# Altium footprint library SENSOR.PcbLib: 56 footprints (part 2 of 4)
Each footprint in its own frame and in the unit in brackets; x right, y up, seen from the top. Pads: shape width x height; smd on the part's side, far side on the other; paste and mask are expansions set on the pad; w line width, h text height; cw(c..) or ccw(c..) is an arc to the next point about the centre after c.
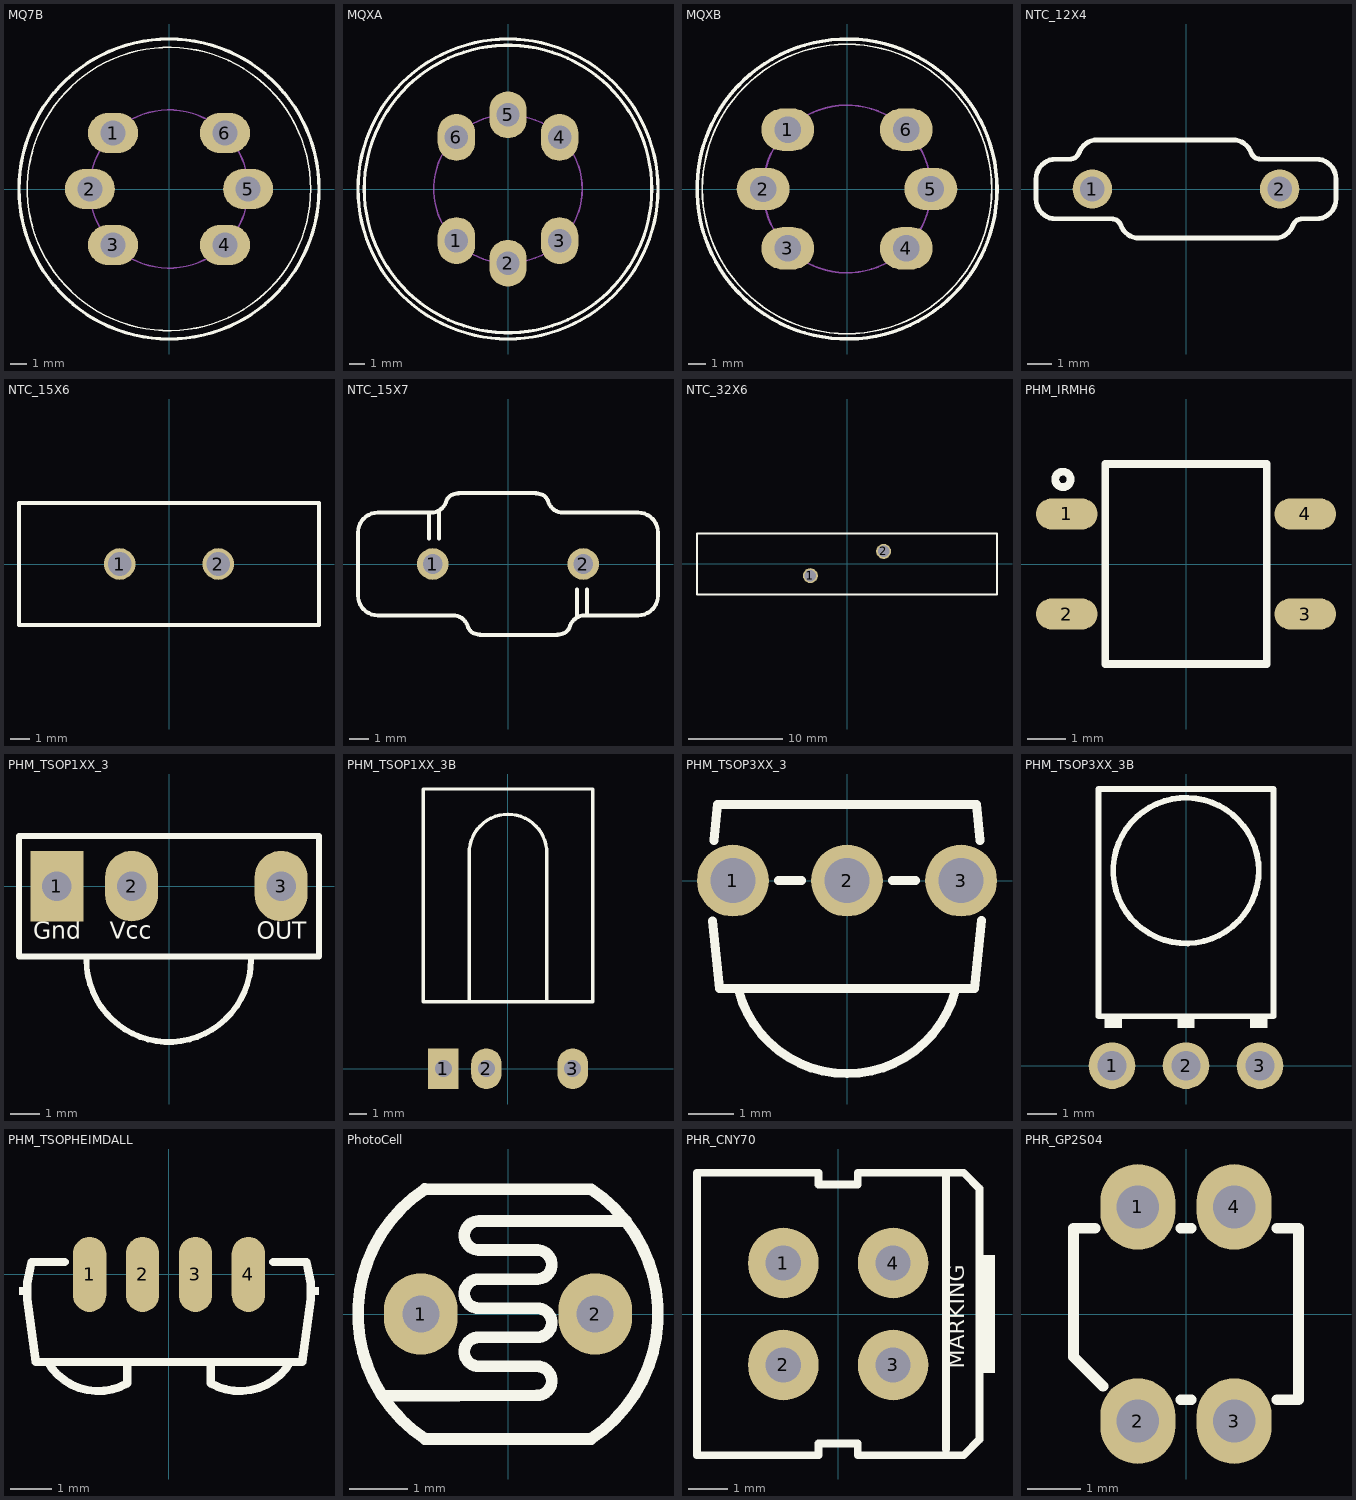
[diagram p1: the footprints below, top view; thin cyan lines are the x and y axes]

## MQ7B [mm] "Sensor GAS, 17.8mm Diameter"
height 10
pads (6):
  oval 3x2.4 hole 1.5: 1(-3.359,3.359) 2(-4.75,0) 3(-3.359,-3.359) 4(3.359,-3.359) 5(4.75,0) 6(3.359,3.359)
Top Overlay:
  circle w0.2: c0,0 r9
  circle w0.1: c0,0 r8.5
Mechanical 1:
  circle w0.1: c0,0 r4.75
3D body: height 1, standoff -5, extent -3.8,-3.8 -2.8,-2.8
3D body: height 1, standoff -5, extent -5.25,-0.5 -4.25,0.5
3D body: height 1, standoff -5, extent -3.8,2.8 -2.8,3.8
3D body: height 1, standoff -5, extent 2.8,2.8 3.8,3.8
3D body: height 1, standoff -5, extent 4.25,-0.5 5.25,0.5
3D body: height 1, standoff -5, extent 2.8,-3.8 3.8,-2.8
3D body: height 10, standoff 0, extent -8.898,-8.9 8.897,8.9

## MQXA [mm] "Sensor GAS, 19mm Diameter"
pads (6):
  oval 2.4x3 hole 1.5: 1(-3.3,-3.3) 2(0,-4.75) 3(3.3,-3.3) 4(3.3,3.3) 5(0,4.75) 6(-3.3,3.3)
Top Overlay:
  circle w0.2: c0,0 r9.6
  circle w0.2: c0,0 r9.2
Mechanical 1:
  circle w0.1: c0,0 r4.75
3D body: height 1, standoff -5, extent -3.8,2.8 -2.8,3.8
3D body: height 1, standoff -5, extent -0.5,4.25 0.5,5.25
3D body: height 1, standoff -5, extent 2.8,2.8 3.8,3.8
3D body: height 1, standoff -5, extent 2.8,-3.8 3.8,-2.8
3D body: height 1, standoff -5, extent -0.5,-5.25 0.5,-4.25
3D body: height 1, standoff -5, extent -3.8,-3.8 -2.8,-2.8
3D body: height 16.5, standoff 6, extent -8,-7.998 8,7.998
3D body: height 6, standoff 0, extent -9.5,-9.497 9.5,9.498

## MQXB [mm] "Sensor GAS, 16.8mm Diameter"
height 10
pads (6):
  oval 3x2.4 hole 1.5: 1(-3.359,3.359) 2(-4.75,0) 3(-3.359,-3.359) 4(3.359,-3.359) 5(4.75,0) 6(3.359,3.359)
Top Overlay:
  circle w0.2: c0,0 r8.5
  circle w0.1: c0,0 r8.2
Mechanical 1:
  circle w0.1: c0,0 r4.75
3D body: height 1, standoff -5, extent -3.8,-3.8 -2.8,-2.8
3D body: height 1, standoff -5, extent -5.25,-0.5 -4.25,0.5
3D body: height 1, standoff -5, extent -3.8,2.8 -2.8,3.8
3D body: height 1, standoff -5, extent 2.8,2.8 3.8,3.8
3D body: height 1, standoff -5, extent 4.25,-0.5 5.25,0.5
3D body: height 1, standoff -5, extent 2.8,-3.8 3.8,-2.8
3D body: height 10, standoff 0, extent -8.398,-8.4 8.398,8.4

## NTC_12X4 [mm] "NTC, pitch 7.5mm, 12X4mm, S10K275"
pads (2):
  round 1.6 / inner round 1.6 / far side oval 1.6x2.4 hole 1: 1(-3.81,0) 2(3.81,0)
Top Overlay:
  lines w0.2: -6.1,-0.41 ccw(c-5.3,-0.41) -5.3,-1.21 -3.6,-1.21 -3.028,-1.21 cw(c-3.028,-1.61) -2.652,-1.474 ccw(c-1.9,-1.2) -1.9,-2 3.6,-2 ccw(c3.6,-1.2) 4.352,-1.474 cw(c4.728,-1.61) 4.728,-1.21 5.3,-1.21 ccw(c5.3,-0.41) 6.1,-0.41 6.1,0.41 ccw(c5.3,0.41) 5.3,1.21 3.6,1.21 3.028,1.21 cw(c3.028,1.61) 2.652,1.474 ccw(c1.9,1.2) 1.9,2 -3.6,2 ccw(c-3.6,1.2) -4.352,1.474 cw(c-4.728,1.61) -4.728,1.21 -5.3,1.21 ccw(c-5.3,0.41) -6.1,0.41 -6.1,-0.41
3D body "User Library-S10K275.STEP": height 13, standoff -2.5, extent -6,-1.901 6,1.899

## NTC_15X6 [mm] "NTC, pitch 5mm, 15X6mm, B57153"
height 15
pads (2):
  round 1.6 / inner round 1.6 / far side oval 2x2.4 hole 1.2: 1(-2.5,0) 2(2.5,0)
Top Overlay:
  lines w0.2: -7.6,-3.1 -7.6,3.1 7.6,3.1 7.6,-3.1 -7.6,-3.1
3D body "NTC_B57153.step": height 21.5, standoff -10, extent -7.5,-3 7.5,3

## NTC_15X7 [mm] "NTC, pitch 7.5mm, 15X7mm, B57237"
pads (2):
  round 1.6 / inner round 1.6 / far side oval 1.6x2.4 hole 1: 1(-3.81,0) 2(3.81,0)
Top Overlay:
  lines w0.2: -4,1.3 -4,2.6 ; -3.5,1.3 -3.5,2.6 ; -1.416,-3.6 2.516,-3.6 ; -1.416,-3.569 cw(c-1.469,-2.971) -2.048,-3.126 ccw(c-2.8,-3.4) -2.8,-2.6 -6.6,-2.6 cw(c-6.6,-1.6) -7.6,-1.6 -7.6,1.6 ; 2.516,-3.569 ccw(c2.569,-2.971) 3.148,-3.126 cw(c3.9,-3.4) 3.9,-2.6 6.6,-2.6 ccw(c6.6,-1.6) 7.6,-1.6 7.6,1.6 ; 3.5,-2.6 3.5,-1.3 ; 4,-2.5 4,-1.3 ; -7.6,1.6 cw(c-6.6,1.6) -6.6,2.6 ; -7.6,1.6 cw(c-6.6,1.6) -6.6,2.6 ; -6.6,2.6 -3.9,2.6 ; -6.6,2.6 -3.9,2.6 ; -3.9,2.6 ccw(c-3.9,3.4) -3.148,3.126 ; -3.9,2.6 ccw(c-3.9,3.4) -3.148,3.126 ; -3.148,3.126 cw(c-2.569,2.971) -2.516,3.569 ccw(c-2.569,2.971) -3.148,3.126 ; 2.048,3.126 ccw(c1.469,2.971) 1.416,3.569 cw(c1.469,2.971) 2.048,3.126 ; 2.048,3.126 ccw(c2.8,3.4) 2.8,2.6 ; 2.048,3.126 ccw(c2.8,3.4) 2.8,2.6 ; 2.8,2.6 6.6,2.6 ; 2.8,2.6 6.6,2.6 ; 6.6,2.6 cw(c6.6,1.6) 7.6,1.6 ; 6.6,2.6 cw(c6.6,1.6) 7.6,1.6 ; -2.516,3.6 1.416,3.6 -2.516,3.6
3D body "User Library-B57237.step": height 22, standoff -29.98, extent -7.5,-3.5 7.5,3.5

## NTC_32X6 [mm] "NTC, pitch 7.5mm, 32X6mm, SG-405"
height 32
pads (2):
  round 1.6 / inner round 1.6 / far side oval 2x2.4 hole 1.2: 1(-3.91,-1.3) 2(3.91,1.3)
Top Overlay:
  lines w0.2: -16,-3.3 -16,3.2 16,3.2 16,-3.3 -16,-3.3
3D body "NTC_SG_405.step": height 32.87, standoff -27, extent -15.875,-3.15 15.875,3.15

## PHM_IRMH6 [mm] "PHOTO, Reflective Optical Sensor, IRM-H638"
pads (4):
  oval 1.6x0.8 smd: 1(-3.1,1.3) 2(-3.1,-1.3) 3(3.1,-1.3) 4(3.1,1.3)
Top Overlay:
  circle w0.2: c-3.2,2.2 r0.2
  lines w0.2: -2.1,-2.6 2.1,-2.6 2.1,2.6 -2.1,2.6 -2.1,-2.6
3D body: height 2.5, standoff 0, extent -2,-2.5 2,2.5
3D body: height 4, standoff 1, extent -1.498,-0.599 1.5,2.4

## PHM_TSOP1XX_3 [mm] "Photo Modules for PCM Remote Control Systems"
pads (3):
  rect 1.8x2.4 hole 1: 1(-3.81,0)
  oval 1.8x2.4 hole 1: 2(-1.27,0) 3(3.81,0)
Top Overlay:
  lines w0.2: -2.81,-2.5 ccw(c-0.01,-2.5) 2.79,-2.5 ; -5.1,-2.4 -5.1,1.7 5.1,1.7 5.1,-2.4 -5.1,-2.4
  text "OUT" at 2.99,-2 h1
  text "Vcc" at -2.01,-2 h1
  text "Gnd" at -4.61,-2 h1
3D body "TSOPxxxx.STEP": height 13.25, standoff -17.35, extent -5.01,-5.15 4.99,1.6

## PHM_TSOP1XX_3B [mm] "IR Sensor (TV Sensor)"
pads (3):
  rect 1.8x2.4 hole 1: 1(-3.81,0)
  oval 1.8x2.4 hole 1: 2(-1.27,0) 3(3.81,0)
Top Overlay:
  lines w0.2: -2.286,3.937 -2.286,12.7 cw(c0,12.7) 2.286,12.7 2.286,3.937 ; -5,3.937 5,3.937 5,16.471 -5,16.471 -5,3.937
3D body "TSOP1238_2009.STEP": height 5.8, standoff -2.15, extent -5,-0.229 5,16.471

## PHM_TSOP3XX_3 [mm] "HS0038B, SFH5110, TSOP322.., TSOP324.., TSOP344.., TSOP348.."
height 6.95
pads (3):
  round 1.6 / inner round 1.6 / far side oval 1.6x2.4 hole 1: 1(-2.54,0) 2(0,0) 3(2.54,0)
Top Overlay:
  lines w0.2: -2.99,-0.899 -2.84,-2.4 2.84,-2.4 2.991,-0.889 ; -2.96,0.896 -2.88,1.7 2.88,1.7 2.96,0.896 ; -2.415,-2.447 ccw(c0,-1.8) 2.415,-2.447 ; -1.524,0 -1.016,0 ; 1.016,0 1.524,0
3D body "User Library-tsop4836.step": height 10.51, standoff -20, extent -3,-4.2 3,1.6

## PHM_TSOP3XX_3B [mm] "TSOP3XX_BENDED"
height 10
pads (3):
  round 1.6 / inner round 1.6 / far side oval 1.6x2.4 hole 1: 1(-2.54,0) 2(0,0) 3(2.54,0)
Top Overlay:
  circle w0.2: c0,6.7 r2.5
  region: 2.8,1.7 2.2,1.7 2.2,1.3 2.8,1.3
  rectangle: -0.3,1.3 0.3,1.7
  rectangle: -2.8,1.3 -2.2,1.7
  lines w0.2: -3,1.7 3,1.7 3,9.5 -3,9.5 -3,1.7
3D body "SFH5110.STEP": height 6.95, standoff -3.6, extent -2.9,-0.2 2.9,9.4

## PHM_TSOPHEIMDALL [mm] "HEIMDALL, TSOP952-4, TSOP753-4, TSOP773-4 ..."
height 3
pads (4):
  oval 0.8x1.8 smd paste-0.1: 1(-1.905,0) 2(-0.635,0) 3(0.635,0) 4(1.905,0)
Top Overlay:
  rectangle: 3.4,-0.5 3.6,-0.3
  region: -3.4,-0.3 -3.6,-0.3 -3.6,-0.5 -3.4,-0.5
  lines w0.2: -2.909,-2.105 ccw(c-1.7,-1.4) -0.995,-2.609 ; -2.5,0.3 -3.3,0.3 -3.4,-0.2 -3.4,-0.6 -3.2,-2.1 3.2,-2.1 3.4,-0.6 3.4,-0.2 3.3,0.3 2.5,0.3 ; -1,-2.609 -1,-2.1 ; 0.995,-2.609 ccw(c1.7,-1.4) 2.909,-2.105 ; 1,-2.609 1,-2.1
3D body "Heimdall.stp": height 3.13, standoff 0.03, extent -3.45,-2.7 3.45,0.5

## PhotoCell [mm]
pads (2):
  oval 1.27x1.397 hole 0.635: 1(-1.5,0) 2(1.5,0)
Top Overlay:
  lines w0.2: -2.16,-1.41 0.5,-1.4 ccw(c0.502,-1.15) 0.501,-0.9 -0.5,-0.9 cw(c-0.502,-0.65) -0.5,-0.4 0.5,-0.4 ccw(c0.502,-0.15) 0.501,0.1 -0.5,0.1 cw(c-0.502,0.35) -0.5,0.6 0.5,0.6 ccw(c0.502,0.85) 0.501,1.1 -0.499,1.1 ; -1.43,-2.15 1.429,-2.15 ; -1.43,2.15 1.429,2.148 cw(c0,0) 1.428,-2.149 ; -1.429,-2.148 cw(c0,0) -1.429,2.148 ; -0.5,1.1 cw(c-0.501,1.35) -0.499,1.6 2.03,1.6
3D body "LDR.STEP": height 2.44, standoff -2.3, extent -2.605,-2.159 2.605,2.141

## PHR_CNY70 [mm] "PHOTO, Reflective Optical Sensor, CNY70"
pads (4):
  round 1.8 hole 0.9: 1(-1.4,1.3) 2(-1.4,-1.3) 3(1.4,-1.3) 4(1.4,1.3)
Top Overlay:
  rectangle: 3.6,-1.5 4,1.5
  lines w0.2: 2.75,-3.45 2.75,3.55 ; -3.6,-3.6 -3.6,3.6 -0.5,3.6 -0.5,3.3 0.5,3.3 0.5,3.6 3.2,3.6 3.6,3.2 3.6,-3.2 3.2,-3.6 0.5,-3.6 0.5,-3.3 -0.5,-3.3 -0.5,-3.6 -3.6,-3.6
  text "MARKING" at 3.35,-1.4 h0.7
3D body "CNY70.step": height 6, standoff -5.75, extent -3.5,-3.5 3.5,3.5

## PHR_GP2S04 [mm] "PHOTO, Reflective Optical Sensor, GP2S04"
pads (4):
  oval 1.4x1.6 hole 0.8: 1(-0.9,2) 2(-0.9,-2) 3(0.9,-2) 4(0.9,2)
Top Overlay:
  lines w0.2: -1.7,1.6 -2.1,1.6 -2.1,-0.8 -1.55,-1.35 ; -0.1,-1.6 0.1,-1.6 ; -0.1,1.6 0.1,1.6 ; 1.7,-1.6 2.1,-1.6 2.1,1.6 1.7,1.6
3D body: height 1.7, standoff 0, extent -2,-1.5 2,1.5
3D body: height 1.3, standoff 0, extent 0.2,-1.2 1.7,1.2
3D body: height 1.65, standoff 1.35, extent 0.2,-1.2 1.7,1.2
3D body: height 1.7, standoff 0, extent -0.2,-1.2 0.2,1.2
3D body: height 1.65, standoff 1.35, extent -1.7,-1.2 -0.2,1.2
3D body: height 1.3, standoff 0, extent -1.7,-1.2 -0.2,1.2